# Altium footprint library DrPCB.PcbLib: 910 footprints (part 39 of 57)
Each footprint in its own frame and in the unit in brackets; x right, y up, seen from the top. Pads: shape width x height; smd on the part's side, far side on the other; paste and mask are expansions set on the pad; w line width, h text height; cw(c..) or ccw(c..) is an arc to the next point about the centre after c.
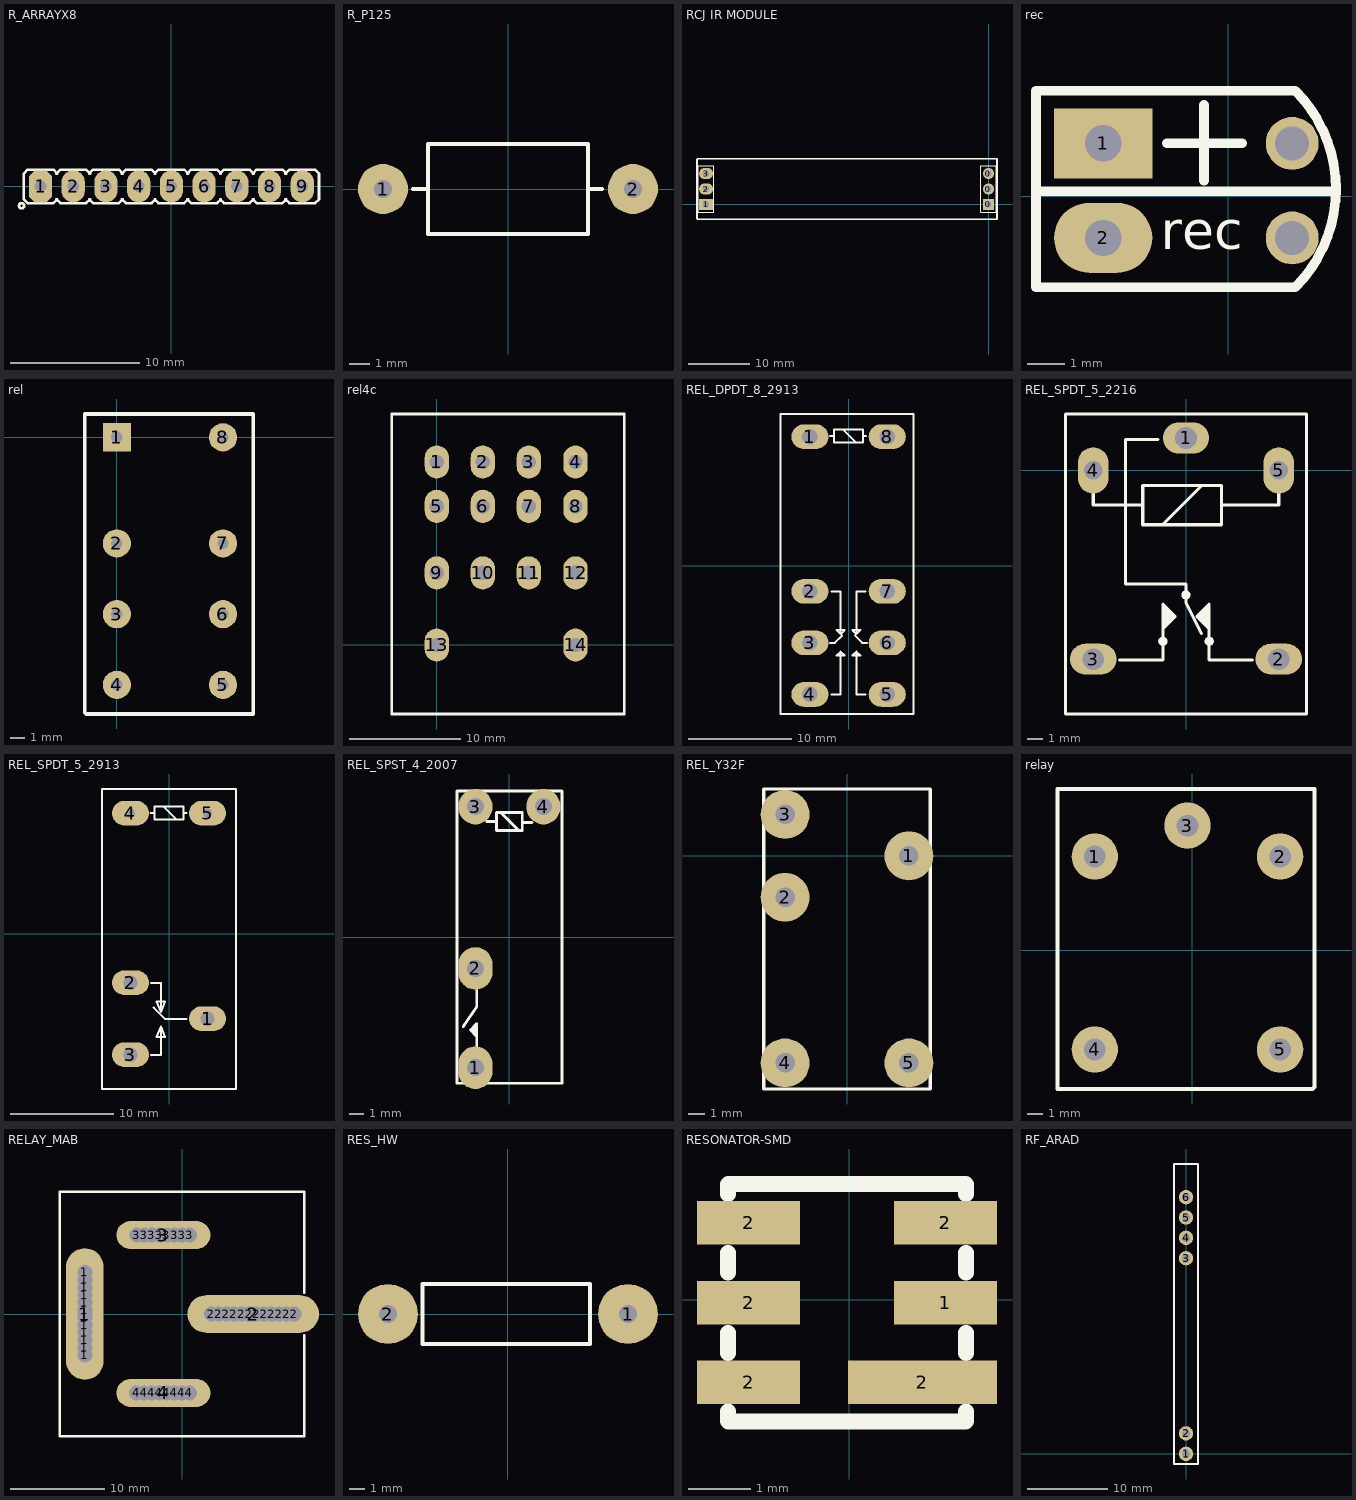
[diagram p38: the footprints below, top view; thin cyan lines are the x and y axes]

## R_ARRAYX8 [mm]
pads (9):
  oct 1.8x2.5 hole 0.9 mask+0.1: 1(-10.16,0)
  oval 1.8x2.5 hole 0.9 mask+0.1: 2(-7.62,0) 3(-5.08,0) 4(-2.54,0) 5(0,0) 6(2.54,0) 7(5.08,0) 8(7.62,0) 9(10.16,0)
Top Overlay:
  circle w0.2: c-11.63,-1.5 r0.2
  lines w0.2: -8.92,-1 -8.62,-1.3 -6.62,-1.3 -6.32,-1 ; -8.92,1 -8.62,1.3 -6.62,1.3 -6.32,1 ; -8.86,-1 -9.16,-1.3 -11.16,-1.3 -11.46,-1 -11.46,1 -11.16,1.3 -9.16,1.3 -8.86,1 ; -6.38,-1 -6.08,-1.3 -4.08,-1.3 -3.78,-1 ; -6.38,1 -6.08,1.3 -4.08,1.3 -3.78,1 ; -3.84,-1 -3.54,-1.3 -1.54,-1.3 -1.24,-1 ; -3.84,1 -3.54,1.3 -1.54,1.3 -1.24,1 ; -1.3,-1 -1,-1.3 1,-1.3 1.3,-1 ; -1.3,1 -1,1.3 1,1.3 1.3,1 ; 1.24,-1 1.54,-1.3 3.54,-1.3 3.84,-1 ; 1.24,1 1.54,1.3 3.54,1.3 3.84,1 ; 3.78,-1 4.08,-1.3 6.08,-1.3 6.38,-1 ; 3.78,1 4.08,1.3 6.08,1.3 6.38,1 ; 6.32,-1 6.62,-1.3 8.62,-1.3 8.92,-1 ; 6.32,1 6.62,1.3 8.62,1.3 8.92,1 ; 8.86,-1 9.16,-1.3 11.16,-1.3 11.46,-1 11.46,1 11.16,1.3 9.16,1.3 8.86,1
3D body "User Library-Resistor Pack 8.STEP": height 5.43, standoff -3, extent -11.405,-1.3 11.405,1.2

## R_P125 [mm] "RESISTOR 1 WATT, AXIAL0.6"
height 5
pads (2):
  round 2.5 hole 0.9: 1(-6.25,0) 2(6.25,0)
Top Overlay:
  lines w0.2: -4.75,0 -4.064,0 ; 4.077,0 4.699,0 ; -4,-2.25 -4,2.25 4,2.25 4,-2.25 -4,-2.25
3D body "User Library-RESAD-1.STEP": height 3.45, standoff -2.35, extent -6.55,-1.65 6.55,1.65

## RCJ IR MODULE [mm]
pads (6):
  rect 1.8x1.8 hole 1: 0(-0.013,0)
  round 1.8 hole 1: 0(-0.013,2.54) 0(-0.013,5.08)
  rect 2.3x1.8 hole 1: 1(-46.342,0)
  oval 2.3x1.8 hole 1: 2(-46.342,2.54) 3(-46.342,5.08)
Top Overlay:
  lines w0.2: -47.612,-1.27 -47.612,6.35 -45.072,6.35 -45.072,-1.27 -47.612,-1.27 ; -1.283,-1.27 -1.283,6.35 1.257,6.35 1.257,-1.27 -1.283,-1.27
  lines w0.254: -47.841,-2.375 -47.841,7.455 ; -47.828,-2.388 1.384,-2.388 1.384,7.442 ; -47.828,7.468 1.384,7.468

## rec [mm]
pads (4):
  rect 2.6x1.85 hole 0.96: 1(-3.302,1.397)
  oval 2.6x1.85 hole 0.96: 2(-3.302,-1.103)
  round 1.4 hole 0.9: ""(1.698,-1.103) ""(1.698,1.397)
Top Overlay:
  lines w0.254: -5.08,0.127 2.794,0.127 ; -1.619,1.397 0.381,1.397 ; -0.635,0.413 -0.635,2.413 ; -5.08,-2.413 -5.08,2.794 1.778,2.794 cw(c-0.826,0.191) 1.778,-2.413 -5.08,-2.413
  text "rec" at -1.778,-1.397 h1

## rel [mm]
pads (8):
  rect 2x2 hole 0.8: 1(0,0)
  round 2 hole 0.8: 2(0,-7.5) 3(0,-12.5) 4(0,-17.5) 5(7.5,-17.5) 6(7.5,-12.5) 7(7.5,-7.5) 8(7.5,0)
Top Overlay:
  lines w0.254: -2.286,-19.431 -2.159,-19.558 9.652,-19.558 9.652,1.651 -2.286,1.651 -2.286,-19.431

## rel4c [mm]
pads (14):
  oval 2.2x3 hole 1.3: 1(0,16.5) 2(4.15,16.5) 3(8.3,16.5) 4(12.5,16.5) 5(0,12.5) 6(4.15,12.5) 7(8.3,12.5) 8(12.5,12.5) 9(0,6.5) 10(4.15,6.5) 11(8.3,6.5) 12(12.5,6.5) 13(0,0) 14(12.5,0)
Top Overlay:
  lines w0.254: -4.064,-6.223 16.891,-6.223 16.891,20.828 -4.064,20.828 -4.064,-6.223

## REL_DPDT_8_2913 [mm] "RELAY, DPDT, 8P, 2.54mm pitch, 29X13mm, G2R-2C, HHC69A, NNC69A, JQX-14FC"
pads (8):
  oval 3.6x2.4 hole 1.5: 1(-3.75,12.5) 2(-3.75,-2.5) 3(-3.75,-7.5) 4(-3.75,-12.5) 5(3.75,-12.5) 6(3.75,-7.5) 7(3.75,-2.5) 8(3.75,12.5)
Top Overlay:
  lines w0.2: -1.8,-7.5 -1.33,-7.5 -0.635,-6.805 ; -1.8,12.556 -1.397,12.556 ; -1.651,-12.5 -0.762,-12.5 -0.762,-8.349 ; -1.651,-2.5 -0.762,-2.5 -0.762,-6.651 ; -0.508,13.191 0.762,11.921 ; 0.635,-6.805 1.33,-7.5 1.8,-7.5 ; 1.397,12.556 1.7,12.556 ; 1.651,-12.5 0.762,-12.5 0.762,-8.349 ; 1.651,-2.5 0.762,-2.5 0.762,-6.651 ; -0.762,-8.349 -0.381,-8.73 -1.143,-8.73 -0.762,-8.349 ; -0.762,-6.651 -1.143,-6.27 -0.381,-6.27 -0.762,-6.651 ; 0.762,-8.349 0.381,-8.73 1.143,-8.73 0.762,-8.349 ; 0.762,-6.651 1.143,-6.27 0.381,-6.27 0.762,-6.651 ; -6.6,-14.4 6.3,-14.4 6.3,14.7 -6.6,14.7 -6.6,-14.4 ; -1.397,11.921 -1.397,13.191 1.397,13.191 1.397,11.921 -1.397,11.921
3D body "User Library-OMRON G2R-2 RELAY.STEP": height 25.46, standoff -4.51, extent -6.5,-14.328 6.225,14.628

## REL_SPDT_5_2216 [mm] "RELAY SPDT, OMRON G5LE SERIES, 22X16mm and 18.8x15.4mm, HJR-3FF, RAS-1215"
pads (5):
  oval 3x2 hole 1.4: 1(0,2.1) 2(6,-12.2) 3(-6,-12.2)
  oval 2x3 hole 1.2: 4(-6,0) 5(6,0)
Top Overlay:
  circle w0.2: c0,-8.05 r0.2
  circle w0.2: c1.5,-11.05 r0.2
  circle w0.2: c-1.5,-11.05 r0.2
  region: 1.5,-8.65 1.5,-10.25 0.7,-9.45
  region: -1.5,-8.65 -1.5,-10.25 -0.7,-9.45
  lines w0.2: -6,-1.3 -6,-2.243 -2.794,-2.242 ; -4.3,-12.25 -1.5,-12.25 -1.5,-8.65 -0.7,-9.45 -1.5,-10.25 ; -1.8,2.012 -3.9,2.012 -3.9,-7.35 0,-7.35 0,-8.55 1,-10.55 ; -1.524,-3.513 1.016,-0.973 ; 1.5,-10.25 0.7,-9.45 1.5,-8.65 1.5,-12.25 4.3,-12.25 ; 6,-1.3 6,-2.243 2.286,-2.243 ; 2.286,-2.243 2.286,-3.512 -2.794,-3.513 -2.794,-0.973 2.286,-0.973 2.286,-2.243 ; -7.8,-15.75 7.8,-15.75 7.8,3.65 -7.8,3.65 -7.8,-15.75
3D body "User Library-RELE.step": height 15.5, standoff -2.5, extent -7.95,-15.75 7.95,3.75

## REL_SPDT_5_2913 [mm]
height 25
pads (5):
  oval 3.6x2.4 hole 1.4: 1(3.75,-8.25) 2(-3.75,-4.75) 3(-3.75,-11.75)
  oval 3.6x2.4 hole 0.9: 4(-3.75,11.75) 5(3.75,11.75)
Top Overlay:
  lines w0.2: -1.8,11.756 -1.397,11.756 ; -1.751,-11.8 -0.8,-11.8 -0.8,-9 ; -1.751,-4.8 -0.8,-4.8 -0.8,-7.6 ; -1.485,-7.185 -0.37,-8.3 1.7,-8.3 ; -0.508,12.391 0.762,11.121 ; 1.397,11.756 1.7,11.756 ; -0.8,-9 -0.4,-10.03 -1.2,-10.03 -0.8,-9 ; -0.8,-7.6 -1.2,-6.57 -0.4,-6.57 -0.8,-7.6 ; -6.5,-15.1 6.5,-15.1 6.5,14.1 -6.5,14.1 -6.5,-15.1 ; -1.397,11.121 -1.397,12.391 1.397,12.391 1.397,11.121 -1.397,11.121
3D body "RELAY_G2R-1.STEP": height 25.5, standoff -4, extent -6.5,-15 6.5,14

## REL_SPST_4_2007 [mm] "RELAY, SPST, 20.5X7.2X15mm"
height 15
pads (4):
  oval 2.4x3 hole 1.2: 1(-2.4,-9.2) 2(-2.4,-2.2)
  oval 2.4x2.5 hole 1.2: 3(-2.4,9.2) 4(2.4,9.2)
Top Overlay:
  region: -2.3,-6.1 -2.3,-7 -2.75,-6.55
  lines w0.2: -3.26,-6.296 -2.3,-4.9 -2.3,-3.2 ; -2.3,-8.2 -2.3,-7 ; -1.6,8.156 -0.997,8.156 ; -0.608,8.791 0.662,7.521 ; 0.9,8.1 1.6,8.1 ; -2.3,-7 -2.3,-6.1 ; -2.3,-7 -2.75,-6.55 -2.3,-6.1 ; -2.3,-6.1 -2.3,-6.1 ; -3.7,-10.3 -3.7,10.3 3.7,10.3 3.7,-10.3 -3.7,-10.3 ; -0.9,7.521 -0.9,8.791 0.9,8.791 0.9,7.521 -0.9,7.521
3D body: height 0, standoff -3.6, extent -2.65,-9.45 -2.15,-8.95
3D body: height 0, standoff -3.6, extent -2.65,-2.45 -2.15,-1.95
3D body: height 0, standoff -3.6, extent 2.15,8.95 2.65,9.45
3D body: height 0, standoff -3.6, extent -2.65,8.95 -2.15,9.45
3D body: height 15, standoff 0, extent -3.6,-10.2 3.6,10.2

## REL_Y32F [mm] "RELAY SPDT, OMRON G5LE SERIES, 22X16mm and 18.8x15.4mm, HJR-3FF, RAS-1215"
pads (5):
  round 3 hole 1.2: 1(3.8,0) 2(-3.8,-2.54) 3(-3.8,2.54) 4(-3.8,-12.7) 5(3.8,-12.7)
Top Overlay:
  lines w0.2: -5.1,-14.3 -5.1,4.1 5.1,4.1 5.1,-14.3 -5.1,-14.3
3D body: height 15.5, standoff 0, extent -5.093,-14.338 5.093,4.115

## relay [mm]
pads (5):
  round 3 hole 1.4: 1(-6.318,6.084) 2(5.682,6.084) 3(-0.318,8.084) 4(-6.318,-6.416) 5(5.682,-6.416)
Top Overlay:
  lines w0.254: -8.731,-8.975 -8.731,10.456 7.906,10.456 7.906,-8.848 7.779,-8.975 -8.731,-8.975

## RELAY_MAB [mm]
pads (44):
  round 1.6 hole 1.6: 1(-10.35,-4.381) 1(-10.35,-3.581) 1(-10.35,-2.782) 1(-10.35,-1.981) 1(-10.35,-1.182) 1(-10.35,-0.382) 1(-10.35,0.419) 1(-10.35,1.218) 1(-10.35,2.018) 1(-10.35,2.819) 1(-10.35,3.618) 1(-10.35,4.419) 2(3.111,0) 2(3.912,0) 2(4.711,0) 2(5.512,0) 2(6.311,0) 2(7.111,0) 2(7.912,0) 2(8.711,0) 2(9.511,0) 2(10.312,0) 2(11.111,0) 2(11.912,0) 3(-4.813,8.4) 3(-4.013,8.4) 3(-3.213,8.4) 3(-2.413,8.4) 3(-1.613,8.4) 3(-0.813,8.4) 3(-0.013,8.4) 3(0.787,8.4) 4(-4.839,-8.4) 4(-4.039,-8.4) 4(-3.239,-8.4) 4(-2.439,-8.4) 4(-1.639,-8.4) 4(-0.839,-8.4) 4(-0.039,-8.4) 4(0.761,-8.4)
  oval 4x14 hole 1.6: 1(-10.35,0)
  oval 14x4 hole 1.6: 2(7.55,0)
  oval 10x3 hole 1.2: 3(-2,8.4) 4(-2,-8.4)
Top Overlay:
  lines w0.254: 13,-2.243 13,-13 -13,-13 -13,13 13,13 13,2.243
3D body "9-1393303-7.stp": height 24.9, standoff -17, extent -12.95,-12.95 12.95,12.95

## RES_HW [mm]
pads (2):
  round 4 hole 1.2: 1(8,0) 2(-8,0)
Top Overlay:
  lines w0.254: -5.7,-2 5.476,-2 5.476,2 -5.7,2 -5.7,-0.793 -5.7,-2

## RESONATOR-SMD [mm]
pads (6):
  rect 1.65x0.7 smd: 1(1.537,-0.051) 2(-1.613,-1.321) 2(-1.613,-0.051) 2(-1.613,1.232) 2(1.537,1.232)
  rect 2.388x0.7 smd: 2(1.168,-1.321)
Top Overlay:
  lines w0.254: -1.943,-1.943 -1.943,-1.791 ; -1.943,-0.851 -1.943,-0.533 ; -1.943,0.432 -1.943,0.749 ; -1.943,1.689 -1.943,1.841 ; -1.938,-1.951 1.862,-1.951 ; -1.938,1.849 1.862,1.849 ; 1.867,-1.943 1.867,-1.791 ; 1.867,-0.851 1.867,-0.533 ; 1.867,0.432 1.867,0.749 ; 1.867,1.689 1.867,1.841

## RF_ARAD [mm]
pads (6):
  round 1.8 hole 1: 1(0,-0.008) 2(0,2.532) 3(0,24.372) 4(0,26.912) 5(0,29.452) 6(0,31.992)
Top Overlay:
  lines w0.254: -1.5,-1.278 -1.5,36.122 ; -1.499,-1.278 1.5,-1.278 1.5,36.122 -1.499,36.122